# Altium footprint library SOM-PX30-BASEBOARD.PcbLib: 17 footprints (part 1 of 2)
Each footprint in its own frame and in the unit in brackets; x right, y up, seen from the top. Pads: shape width x height; smd on the part's side, far side on the other; paste and mask are expansions set on the pad; w line width, h text height; cw(c..) or ccw(c..) is an arc to the next point about the centre after c.
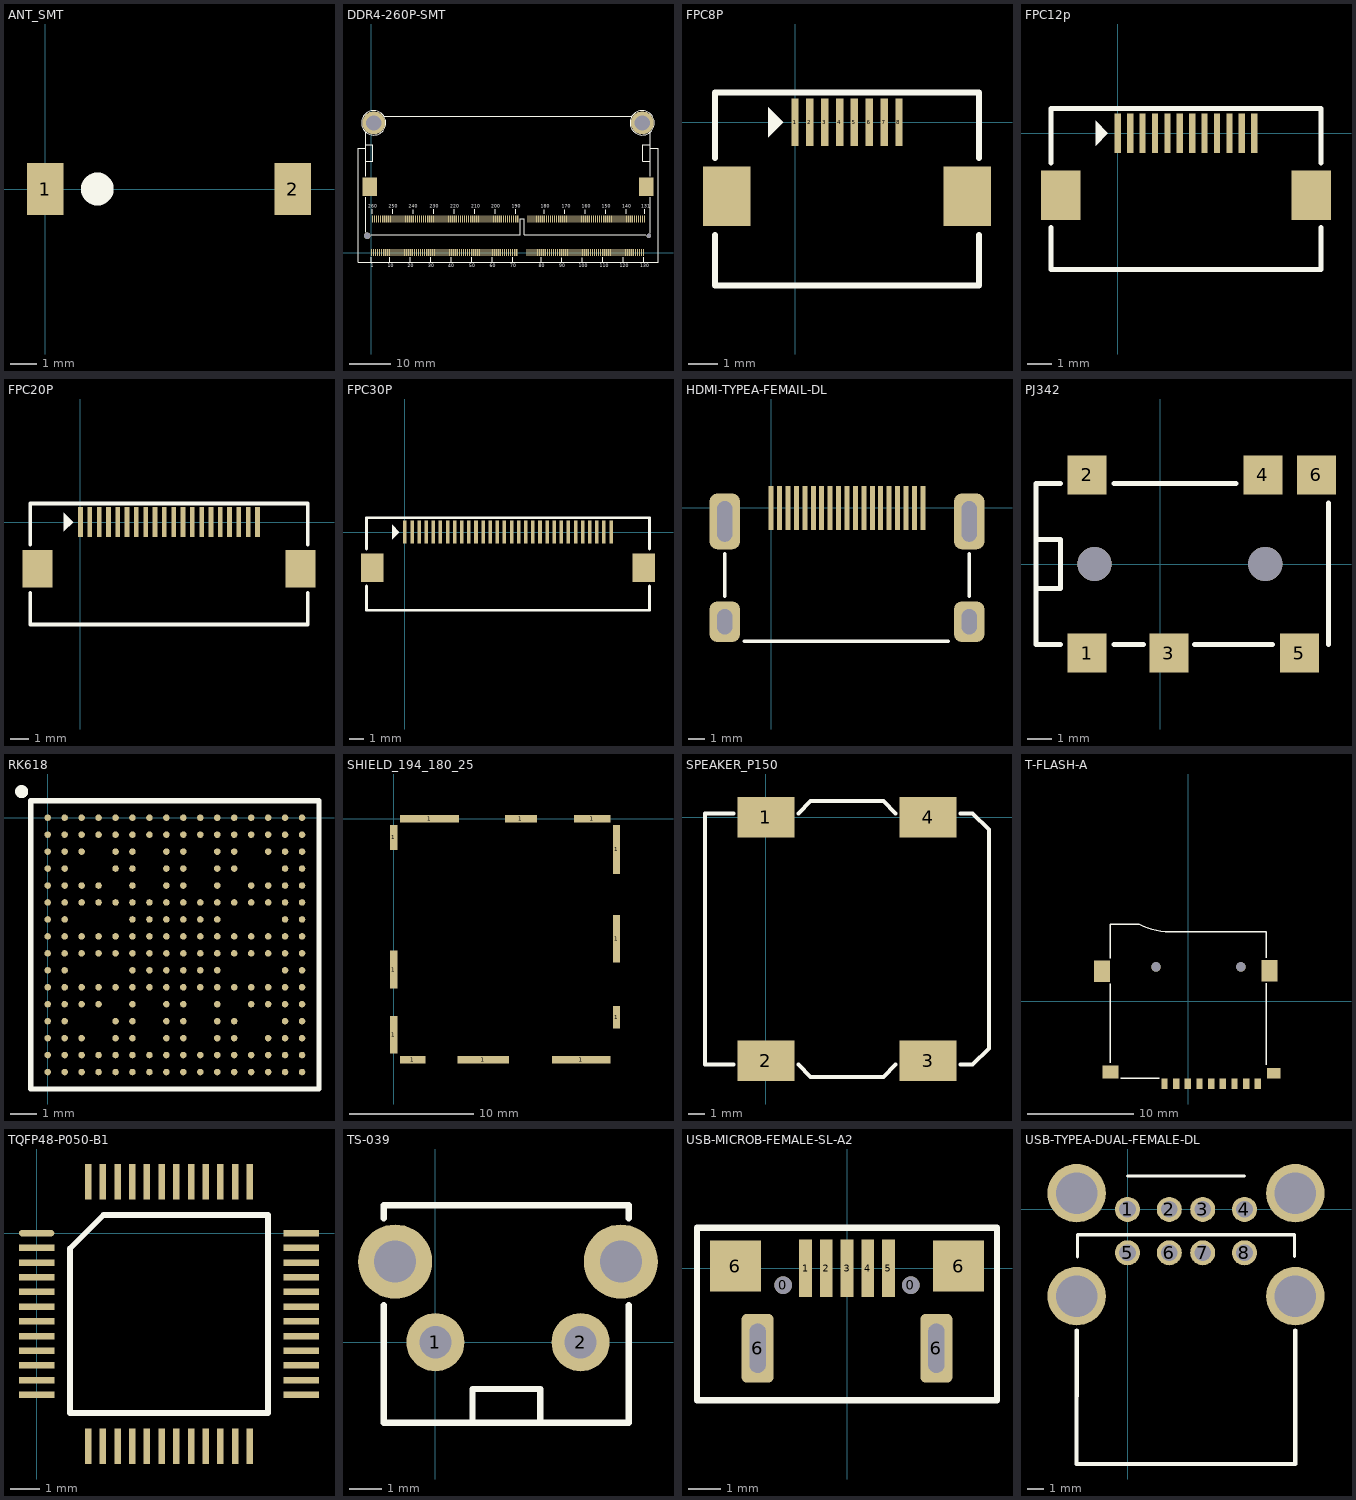
[diagram p0: the footprints below, top view; thin cyan lines are the x and y axes]

## ANT_SMT [mm]
pads (2):
  rect 1.4x2 smd: 1(0,0) 2(9.5,0)
Top Overlay:
  circle w0.7: c2,0 r0.28

## DDR4-260P-SMT [mm] "DDR4-260P-SMT"
pads (266):
  rect 0.3x1.75 smd: 1(0,0) 2(0.5,0) 3(1,0) 4(1.5,0) 5(2,0) 6(2.5,0) 7(3,0) 8(3.5,0) 9(4,0) 10(4.5,0) 11(5,0) 12(5.5,0) 13(6,0) 14(6.5,0) 15(7,0) 16(7.5,0) 17(8,0) 18(8.5,0) 19(9,0) 20(9.5,0) 21(10,0) 22(10.5,0) 23(11,0) 24(11.5,0) 25(12,0) 26(12.5,0) 27(13,0) 28(13.5,0) 29(14,0) 30(14.5,0) 31(15,0) 32(15.5,0) 33(16,0) 34(16.5,0) 35(17,0) 36(17.5,0) 37(18,0) 38(18.5,0) 39(19,0) 40(19.5,0) 41(20,0) 42(20.5,0) 43(21,0) 44(21.5,0) 45(22,0) 46(22.5,0) 47(23,0) 48(23.5,0) 49(24,0) 50(24.5,0) 51(25,0) 52(25.5,0) 53(26,0) 54(26.5,0) 55(27,0) 56(27.5,0) 57(28,0) 58(28.5,0) 59(29,0) 60(29.5,0) 61(30,0) 62(30.5,0) 63(31,0) 64(31.5,0) 65(32,0) 66(32.5,0) 67(33,0) 68(33.5,0) 69(34,0) 70(34.5,0) 71(35,0) 72(35.5,0) 73(38,0) 74(38.5,0) 75(39,0) 76(39.5,0) 77(40,0) 78(40.5,0) 79(41,0) 80(41.5,0) 81(42,0) 82(42.5,0) 83(43,0) 84(43.5,0) 85(44,0) 86(44.5,0) 87(45,0) 88(45.5,0) 89(46,0) 90(46.5,0) 91(47,0) 92(47.5,0) 93(48,0) 94(48.5,0) 95(49,0) 96(49.5,0) 97(50,0) 98(50.5,0) 99(51,0) 100(51.5,0) 101(52,0) 102(52.5,0) 103(53,0) 104(53.5,0) 105(54,0) 106(54.5,0) 107(55,0) 108(55.5,0) 109(56,0) 110(56.5,0) 111(57,0) 112(57.5,0) 113(58,0) 114(58.5,0) 115(59,0) 116(59.5,0) 117(60,0) 118(60.5,0) 119(61,0) 120(61.5,0) 121(62,0) 122(62.5,0) 123(63,0) 124(63.5,0) 125(64,0) 126(64.5,0) 127(65,0) 128(65.5,0) 129(66,0) 130(66.5,0) 131(66.75,8.2) 132(66.25,8.2) 133(65.75,8.2) 134(65.25,8.2) 135(64.75,8.2) 136(64.25,8.2) 137(63.75,8.2) 138(63.25,8.2) 139(62.75,8.2) 140(62.25,8.2) 141(61.75,8.2) 142(61.25,8.2) 143(60.75,8.2) 144(60.25,8.2) 145(59.75,8.2) 146(59.25,8.2) 147(58.75,8.2) 148(58.25,8.2) 149(57.75,8.2) 150(57.25,8.2) 151(56.75,8.2) 152(56.25,8.2) 153(55.75,8.2) 154(55.25,8.2) 155(54.75,8.2) 156(54.25,8.2) 157(53.75,8.2) 158(53.25,8.2) 159(52.75,8.2) 160(52.25,8.2) 161(51.75,8.2) 162(51.25,8.2) 163(50.75,8.2) 164(50.25,8.2) 165(49.75,8.2) 166(49.25,8.2) 167(48.75,8.2) 168(48.25,8.2) 169(47.75,8.2) 170(47.25,8.2) 171(46.75,8.2) 172(46.25,8.2) 173(45.75,8.2) 174(45.25,8.2) 175(44.75,8.2) 176(44.25,8.2) 177(43.75,8.2) 178(43.25,8.2) 179(42.75,8.2) 180(42.25,8.2) 181(41.75,8.2) 182(41.25,8.2) 183(40.75,8.2) 184(40.25,8.2) 185(39.75,8.2) 186(39.25,8.2) 187(38.75,8.2) 188(38.25,8.2) 189(35.75,8.2) 190(35.25,8.2) 191(34.75,8.2) 192(34.25,8.2) 193(33.75,8.2) 194(33.25,8.2) 195(32.75,8.2) 196(32.25,8.2) 197(31.75,8.2) 198(31.25,8.2) 199(30.75,8.2) 200(30.25,8.2) 201(29.75,8.2) 202(29.25,8.2) 203(28.75,8.2) 204(28.25,8.2) 205(27.75,8.2) 206(27.25,8.2) 207(26.75,8.2) 208(26.25,8.2) 209(25.75,8.2) 210(25.25,8.2) 211(24.75,8.2) 212(24.25,8.2) 213(23.75,8.2) 214(23.25,8.2) 215(22.75,8.2) 216(22.25,8.2) 217(21.75,8.2) 218(21.25,8.2) 219(20.75,8.2) 220(20.25,8.2) 221(19.75,8.2) 222(19.25,8.2) 223(18.75,8.2) 224(18.25,8.2) 225(17.75,8.2) 226(17.25,8.2) 227(16.75,8.2) 228(16.25,8.2) 229(15.75,8.2) 230(15.25,8.2) 231(14.75,8.2) 232(14.25,8.2) 233(13.75,8.2) 234(13.25,8.2) 235(12.75,8.2) 236(12.25,8.2) 237(11.75,8.2) 238(11.25,8.2) 239(10.75,8.2) 240(10.25,8.2) 241(9.75,8.2) 242(9.25,8.2) 243(8.75,8.2) 244(8.25,8.2) 245(7.75,8.2) 246(7.25,8.2) 247(6.75,8.2) 248(6.25,8.2) 249(5.75,8.2) 250(5.25,8.2) 251(4.75,8.2) 252(4.25,8.2) 253(3.75,8.2) 254(3.25,8.2) 255(2.75,8.2) 256(2.25,8.2) 257(1.75,8.2) 258(1.25,8.2) 259(0.75,8.2) 260(0.25,8.2)
  round 1.6 hole 1.6: " "(-1.025,4.1)
  rect 3.5x4.6 smd: " "(-0.425,16.1) " "(67.175,16.1)
  round 1.1 hole 1.1: " "(67.775,4.1)
  round 5.6 hole 3.7: ""(0.575,31.7) ""(66.175,31.7)
Top Overlay:
  circle w0.15: c0.575,31.7 r2.973
  circle w0.15: c66.175,31.7 r2.973
  lines w0.15: -1.425,4.999 -1.425,13.499 ; -1.425,18.699 -1.425,22.3 ; -1.425,26.3 0.375,26.3 0.375,22.3 -1.425,22.3 ; -1.425,29.499 -1.425,25.55 ; -0.025,-2.225 -0.025,-1.175 ; -0.026,4.3 36.375,4.3 36.375,8.3 37.375,8.3 37.375,4.3 67.075,4.3 ; 0.225,9.5 0.225,10.55 ; 3.075,33.3 63.675,33.3 ; 4.5,-2.225 4.5,-1.175 ; 5.25,9.5 5.25,10.55 ; 9.5,-2.25 9.5,-1.2 ; 10.25,9.475 10.25,10.525 ; 14.5,-2.225 14.5,-1.175 ; 15.25,9.5 15.25,10.55 ; 19.5,-2.2 19.5,-1.15 ; 20.25,9.525 20.25,10.575 ; 24.5,-2.2 24.5,-1.15 ; 25.25,9.525 25.25,10.575 ; 29.5,-2.2 29.5,-1.15 ; 30.25,9.525 30.25,10.575 ; 34.475,-2.2 34.475,-1.15 ; 35.225,9.525 35.225,10.575 ; 41.5,-2.25 41.5,-1.2 ; 42.25,9.475 42.25,10.525 ; 46.475,-2.275 46.475,-1.225 ; 47.225,9.45 47.225,10.5 ; 51.5,-2.275 51.5,-1.225 ; 52.25,9.45 52.25,10.5 ; 56.5,-2.25 56.5,-1.2 ; 57.25,9.475 57.25,10.525 ; 61.525,-2.225 61.525,-1.175 ; 62.275,9.5 62.275,10.55 ; 66.5,-2.225 66.5,-1.175 ; 66.75,9.5 66.75,10.55 ; 68.175,4.699 68.175,13.499 ; 68.175,18.699 68.175,22.3 ; 68.175,26.3 66.35,26.3 66.35,22.3 68.175,22.3 ; 68.175,29.499 68.175,25.55 ; -1.425,22.3 -1.425,25.55 ; -1.425,25.55 -3.275,25.55 -3.275,-2.301 70.025,-2.301 70.025,25.55 68.175,25.55 ; 68.175,22.3 68.175,25.55
  text "1" at -0.175,-3.601 h0.8
  text "70" at 33.875,-3.601 h0.8
  text "90" at 45.875,-3.601 h0.8
  text "110" at 55.825,-3.601 h0.8
  text "10" at 4.025,-3.601 h0.8
  text "250" at 4.275,10.899 h0.8
  text "20" at 8.925,-3.601 h0.8
  text "30" at 13.875,-3.601 h0.8
  text "240" at 9.125,10.899 h0.8
  text "40" at 18.775,-3.601 h0.8
  text "220" at 19.325,10.899 h0.8
  text "60" at 28.975,-3.601 h0.8
  text "210" at 24.375,10.899 h0.8
  text "200" at 29.275,10.899 h0.8
  text "190" at 34.325,10.899 h0.8
  text "80" at 40.925,-3.601 h0.8
  text "180" at 41.375,10.899 h0.8
  text "170" at 46.475,10.899 h0.8
  text "100" at 50.625,-3.601 h0.8
  text "160" at 51.425,10.899 h0.8
  text "120" at 60.625,-3.601 h0.8
  text "140" at 61.275,10.899 h0.8
  text "130" at 65.675,-3.601 h0.8
  text "131" at 65.875,10.899 h0.8
  text "260" at -0.775,10.899 h0.8
  text "50" at 23.925,-3.601 h0.8
  text "230" at 14.275,10.899 h0.8
  text "150" at 56.325,10.899 h0.8
3D body "User Library-00003870_TEcon_2309409-1.STEP": height 5.27, standoff -0.28, extent -3.1,-0.6 69.9,25.25

## FPC8P [mm] "FPC30P-0D5"
pads (10):
  rect 0.25x1.6 smd: 1(0,0) 2(0.5,0) 3(1,0) 4(1.5,0) 5(2,0) 6(2.5,0) 7(3,0) 8(3.5,0)
  rect 1.6x2 smd: ""(-2.3,-2.5) ""(5.8,-2.5)
Top Overlay:
  region: -0.9,-0.5 -0.9,0.5 -0.4,0
  lines w0.2: -2.7,-3.8 -2.7,-5.5 6.2,-5.5 6.2,-3.8 ; -2.7,-1.2 -2.7,1 6.2,1 6.2,-1.2

## FPC12p [mm] "FPC30P-0D5"
pads (14):
  rect 0.25x1.6 smd: 1(0,0) 2(0.5,0) 3(1,0) 4(1.5,0) 5(2,0) 6(2.5,0) 7(3,0) 8(3.5,0) 9(4,0) 10(4.5,0) 11(5,0) 12(5.5,0)
  rect 1.6x2 smd: ""(-2.3,-2.5) ""(7.8,-2.5)
Top Overlay:
  region: -0.9,-0.5 -0.9,0.5 -0.4,0
  lines w0.2: -2.7,-3.8 -2.7,-5.5 8.2,-5.5 8.2,-3.8 ; -2.7,-1.2 -2.7,1 8.2,1 8.2,-1.2

## FPC20P [mm] "FPC30P-0D5"
pads (22):
  rect 0.25x1.6 smd: 1(0,0) 2(0.5,0) 3(1,0) 4(1.5,0) 5(2,0) 6(2.5,0) 7(3,0) 8(3.5,0) 9(4,0) 10(4.5,0) 11(5,0) 12(5.5,0) 13(6,0) 14(6.5,0) 15(7,0) 16(7.5,0) 17(8,0) 18(8.5,0) 19(9,0) 20(9.5,0)
  rect 1.6x2 smd: ""(-2.3,-2.5) ""(11.8,-2.5)
Top Overlay:
  region: -0.9,-0.5 -0.9,0.5 -0.4,0
  lines w0.2: -2.7,-3.8 -2.7,-5.5 12.2,-5.5 12.2,-3.8 ; -2.7,-1.2 -2.7,1 12.2,1 12.2,-1.2

## FPC30P [mm] "FPC30P-0D5"
pads (32):
  rect 0.25x1.6 smd: 1(0,0) 2(0.5,0) 3(1,0) 4(1.5,0) 5(2,0) 6(2.5,0) 7(3,0) 8(3.5,0) 9(4,0) 10(4.5,0) 11(5,0) 12(5.5,0) 13(6,0) 14(6.5,0) 15(7,0) 16(7.5,0) 17(8,0) 18(8.5,0) 19(9,0) 20(9.5,0) 21(10,0) 22(10.5,0) 23(11,0) 24(11.5,0) 25(12,0) 26(12.5,0) 27(13,0) 28(13.5,0) 29(14,0) 30(14.5,0)
  rect 1.6x2 smd: ""(-2.3,-2.5) ""(16.8,-2.5)
Top Overlay:
  region: -0.9,-0.5 -0.9,0.5 -0.4,0
  lines w0.2: -2.7,-3.8 -2.7,-5.5 17.2,-5.5 17.2,-3.8 ; -2.7,-1.2 -2.7,1 17.2,1 17.2,-1.2

## HDMI-TYPEA-FEMAIL-DL [mm]
pads (23):
  rect 0.3x2.6 smd: 1(0,0) 2(0.5,0) 3(1,0) 4(1.5,0) 5(2,0) 6(2.5,0) 7(3,0) 8(3.5,0) 9(4,0) 10(4.5,0) 11(5,0) 12(5.5,0) 13(6,0) 14(6.5,0) 15(7,0) 16(7.5,0) 17(8,0) 18(8.5,0) 19(9,0)
  rrect50% 1.8x2.4 hole 0.9 slot 1.5 at 90 deg: ""(-2.75,-6.75) ""(11.75,-6.75)
  rrect50% 1.8x3.3 hole 0.9 slot 2.4 at 90 deg: ""(-2.75,-0.8) ""(11.75,-0.8)
Top Overlay:
  lines w0.2: -2.75,-5.25 -2.75,-2.7 ; -1.6,-7.9 10.5,-7.9 ; 11.75,-5.25 11.75,-2.7
3D body "HDMI.STEP": height 6.23, standoff -2.15, extent -3,-11.4 12,0.75

## PJ342 [mm] "PJ-3537"
pads (8):
  rect 1.6x1.6 smd: 1(-3.001,-3.65) 2(-3.001,3.65) 3(0.349,-3.65) 4(4.2,3.65) 5(5.699,-3.65) 6(6.399,3.65)
  round 1.4 hole 1.4: " "(-2.701,0) " "(4.3,0)
Top Overlay:
  lines w0.201: -5.102,3.3 -5.102,-3.3 -4.1,-3.3 ; -5.1,-1 -4.1,-1 -4.1,1 -5.1,1 ; -5.1,3.3 -4.1,3.3 ; -1.9,-3.3 -0.7,-3.299 ; -1.9,3.3 3.1,3.3 ; 1.4,-3.299 4.6,-3.3 ; 6.9,-3.3 6.9,2.5
3D body "PJ342.STEP": height 4.75, standoff -0.6, extent -7.125,-4.125 6.875,4.175

## RK618 [mm]
pads (216):
  round 0.25 smd mask+0.05: A1(0,0) A2(0.65,0) A3(1.3,0) A4(1.95,0) A5(2.6,0) A6(3.25,0) A7(3.9,0) A8(4.55,0) A9(5.2,0) A10(5.85,0) A11(6.5,0) A12(7.15,0) A13(7.8,0) A14(8.45,0) A15(9.1,0) A16(9.75,0) B1(0,-0.65) B2(0.65,-0.65) B3(1.3,-0.65) B4(1.95,-0.65) B5(2.6,-0.65) B6(3.25,-0.65) B7(3.9,-0.65) B8(4.55,-0.65) B9(5.2,-0.65) B10(5.85,-0.65) B11(6.5,-0.65) B12(7.15,-0.65) B13(7.8,-0.65) B14(8.45,-0.65) B15(9.1,-0.65) B16(9.75,-0.65) C1(0,-1.3) C2(0.65,-1.3) C3(1.3,-1.3) C5(2.6,-1.3) C6(3.25,-1.3) C8(4.55,-1.3) C9(5.2,-1.3) C11(6.5,-1.3) C12(7.15,-1.3) C14(8.45,-1.3) C15(9.1,-1.3) C16(9.75,-1.3) D1(0,-1.95) D2(0.65,-1.95) D5(2.6,-1.95) D6(3.25,-1.95) D8(4.55,-1.95) D9(5.2,-1.95) D11(6.5,-1.95) D12(7.15,-1.95) D15(9.1,-1.95) D16(9.75,-1.95) E1(0,-2.6) E2(0.65,-2.6) E3(1.3,-2.6) E4(1.95,-2.6) E6(3.25,-2.6) E8(4.55,-2.6) E9(5.2,-2.6) E11(6.5,-2.6) E13(7.8,-2.6) E14(8.45,-2.6) E15(9.1,-2.6) E16(9.75,-2.6) F1(0,-3.25) F2(0.65,-3.25) F3(1.3,-3.25) F4(1.95,-3.25) F5(2.6,-3.25) F6(3.25,-3.25) F7(3.9,-3.25) F8(4.55,-3.25) F9(5.2,-3.25) F10(5.85,-3.25) F11(6.5,-3.25) F12(7.15,-3.25) F13(7.8,-3.25) F14(8.45,-3.25) F15(9.1,-3.25) F16(9.75,-3.25) G1(0,-3.9) G2(0.65,-3.9) G6(3.25,-3.9) G7(3.9,-3.9) G8(4.55,-3.9) G9(5.2,-3.9) G10(5.85,-3.9) G11(6.5,-3.9) G15(9.1,-3.9) G16(9.75,-3.9) H1(0,-4.55) H2(0.65,-4.55) H3(1.3,-4.55) H4(1.95,-4.55) H5(2.6,-4.55) H6(3.25,-4.55) H7(3.9,-4.55) H8(4.55,-4.55) H9(5.2,-4.55) H10(5.85,-4.55) H11(6.5,-4.55) H12(7.15,-4.55) H13(7.8,-4.55) H14(8.45,-4.55) H15(9.1,-4.55) H16(9.75,-4.55) J1(0,-5.2) J2(0.65,-5.2) J3(1.3,-5.2) J4(1.95,-5.2) J5(2.6,-5.2) J6(3.25,-5.2) J7(3.9,-5.2) J8(4.55,-5.2) J9(5.2,-5.2) J10(5.85,-5.2) J11(6.5,-5.2) J12(7.15,-5.2) J13(7.8,-5.2) J14(8.45,-5.2) J15(9.1,-5.2) J16(9.75,-5.2) K1(0,-5.85) K2(0.65,-5.85) K6(3.25,-5.85) K7(3.9,-5.85) K8(4.55,-5.85) K9(5.2,-5.85) K10(5.85,-5.85) K11(6.5,-5.85) K15(9.1,-5.85) K16(9.75,-5.85) L1(0,-6.5) L2(0.65,-6.5) L3(1.3,-6.5) L4(1.95,-6.5) L5(2.6,-6.5) L6(3.25,-6.5) L7(3.9,-6.5) L8(4.55,-6.5) L9(5.2,-6.5) L10(5.85,-6.5) L11(6.5,-6.5) L12(7.15,-6.5) L13(7.8,-6.5) L14(8.45,-6.5) L15(9.1,-6.5) L16(9.75,-6.5) M1(0,-7.15) M2(0.65,-7.15) M3(1.3,-7.15) M4(1.95,-7.15) M6(3.25,-7.15) M8(4.55,-7.15) M9(5.2,-7.15) M11(6.5,-7.15) M13(7.8,-7.15) M14(8.45,-7.15) M15(9.1,-7.15) M16(9.75,-7.15) N1(0,-7.8) N2(0.65,-7.8) N5(2.6,-7.8) N6(3.25,-7.8) N8(4.55,-7.8) N9(5.2,-7.8) N11(6.5,-7.8) N12(7.15,-7.8) N15(9.1,-7.8) N16(9.75,-7.8) P1(0,-8.45) P2(0.65,-8.45) P3(1.3,-8.45) P5(2.6,-8.45) P6(3.25,-8.45) P8(4.55,-8.45) P9(5.2,-8.45) P11(6.5,-8.45) P12(7.15,-8.45) P14(8.45,-8.45) P15(9.1,-8.45) P16(9.75,-8.45) R1(0,-9.1) R2(0.65,-9.1) R3(1.3,-9.1) R4(1.95,-9.1) R5(2.6,-9.1) R6(3.25,-9.1) R7(3.9,-9.1) R8(4.55,-9.1) R9(5.2,-9.1) R10(5.85,-9.1) R11(6.5,-9.1) R12(7.15,-9.1) R13(7.8,-9.1) R14(8.45,-9.1) R15(9.1,-9.1) R16(9.75,-9.1) T1(0,-9.75) T2(0.65,-9.75) T3(1.3,-9.75) T4(1.95,-9.75) T5(2.6,-9.75) T6(3.25,-9.75) T7(3.9,-9.75) T8(4.55,-9.75) T9(5.2,-9.75) T10(5.85,-9.75) T11(6.5,-9.75) T12(7.15,-9.75) T13(7.8,-9.75) T14(8.45,-9.75) T15(9.1,-9.75) T16(9.75,-9.75)
Top Overlay:
  circle w0.3: c-1,1 r0.1
  lines w0.2: -0.65,-10.4 -0.65,0.65 10.4,0.65 10.4,-10.4 -0.65,-10.4

## SHIELD_194_180_25 [mm]
pads (12):
  rect 0.6x3.06 smd: 1(0,-17.47) 1(0,-12.2)
  rect 0.6x2.04 smd: 1(0,-1.52)
  rect 2.05x0.6 smd: 1(1.525,-19.5)
  rect 4.78x0.6 smd: 1(2.89,0)
  rect 4.16x0.6 smd: 1(7.218,-19.5)
  rect 2.57x0.6 smd: 1(10.275,0)
  rect 4.71x0.6 smd: 1(15.145,-19.5)
  rect 2.93x0.6 smd: 1(16.035,0)
  rect 0.6x1.8 smd: 1(18,-16.06)
  rect 0.6x3.84 smd: 1(18,-9.7)
  rect 0.6x3.98 smd: 1(18,-2.49)

## SPEAKER_P150 [mm]
pads (4):
  rect 3.5x2.5 smd: 1(0,0) 2(0,-15) 3(10,-15) 4(10,0)
Top Overlay:
  lines w0.25: -2,-15.25 -3.75,-15.25 -3.75,0.25 -2,0.25 ; 2,-15.25 2.75,-16 7.25,-16 8,-15.25 ; 2,0.25 2.75,1 7.25,1 8,0.25 ; 12,-15.25 12.75,-15.25 13.75,-14.25 13.75,-0.75 12.75,0.25 12,0.25

## T-FLASH-A [mil] "T-FLASH-A"
pads (15):
  rect 23.6x39.4 smd: 1(-88.57,-305.13) 2(-45.27,-305.13) 3(-1.97,-305.13) 4(41.33,-305.13) 5(84.63,-305.13) 6(127.93,-305.13) 7(171.23,-305.13) 8(214.53,-305.13) 9(257.83,-305.13)
  round 35 hole 35: " "(-120.07,127.97) " "(194.93,127.97)
  rect 59.1x78.7 smd: ""(-320.87,112.17) ""(301.23,114.19)
  rect 59.1x47.2 smd: ""(-289.37,-261.83)
  rect 51.2x39.4 smd: ""(316.93,-265.73)
Top Overlay:
  lines w5: -289.37,-228.35 -289.37,64.96 ; -289.37,159.45 -289.37,285.47 -183.07,285.47 ccw(c-64.75,522.83) -53.17,257.87 289.33,257.87 289.33,161.42 ; -250,-285.43 -108.27,-285.43 ; 289.33,-234.29 289.33,66.93
3D body "TF-01A.step": height 80.71, standoff -13.78, extent -318.9,-311.43 314.96,390.17

## TQFP48-P050-B1 [mm]
pads (48):
  oval 1.2x0.22 smd: 1(0,0)
  rect 1.2x0.22 smd: 2(0,-0.5) 3(0,-1) 4(0,-1.5) 5(0,-2) 6(0,-2.5) 7(0,-3) 8(0,-3.5) 9(0,-4) 10(0,-4.5) 11(0,-5) 12(0,-5.5) 25(9,-5.5) 26(9,-5) 27(9,-4.5) 28(9,-4) 29(9,-3.5) 30(9,-3) 31(9,-2.5) 32(9,-2) 33(9,-1.5) 34(9,-1) 35(9,-0.5) 36(9,0)
  rect 0.22x1.2 smd: 13(1.75,-7.25) 14(2.25,-7.25) 15(2.75,-7.25) 16(3.25,-7.25) 17(3.75,-7.25) 18(4.25,-7.25) 19(4.75,-7.25) 20(5.25,-7.25) 21(5.75,-7.25) 22(6.25,-7.25) 23(6.75,-7.25) 24(7.25,-7.25) 37(7.25,1.75) 38(6.75,1.75) 39(6.25,1.75) 40(5.75,1.75) 41(5.25,1.75) 42(4.75,1.75) 43(4.25,1.75) 44(3.75,1.75) 45(3.25,1.75) 46(2.75,1.75) 47(2.25,1.75) 48(1.75,1.75)
Top Overlay:
  lines w0.2: 1.135,-6.115 1.135,-0.52 2.27,0.615 7.865,0.615 7.865,-6.115 1.135,-6.115

## TS-039 [mm] "TS-039"
pads (4):
  round 1.8 hole 1: 1(0,0) 2(4.5,0)
  round 2.3 hole 1.3: ""(-1.25,2.5) ""(5.75,2.5)
Top Overlay:
  lines w0.2: -1.6,1.15 -1.6,-2.5 6,-2.5 6,1.15 ; -1.6,3.85 -1.6,4.25 6,4.25 6,3.85 ; 1.15,-2.5 1.15,-1.45 2.2,-1.45 3.25,-1.45 3.25,-2.5
3D body "TS6-THT-RA_H-4.3.step": height 7, standoff -3.5, extent -1.997,-3.1 6.397,3.95

## USB-MICROB-FEMALE-SL-A2 [mm]
pads (11):
  round 0.55 hole 0.55 paste-5 mask+0.102: 0(-2,-0.525) 0(2,-0.525)
  rect 0.4x1.8 smd: 1(-1.3,0) 2(-0.65,0) 3(0,0) 4(0.65,0) 5(1.3,0)
  rect 1.6x1.6 smd: 6(-3.5,0.075) 6(3.5,0.075)
  rrect30% 1x2.15 hole 0.5 slot 1.55 at 90 deg paste+0: 6(-2.8,-2.5)
  rrect30% 1x2.15 hole 0.5 slot 1.55 at 90 deg: 6(2.8,-2.5)
Top Overlay:
  lines w0.2: -4.7,-4.125 4.7,-4.125 4.7,1.27 -4.7,1.27 -4.7,-4.125
3D body "User Library-usb_port_ch.STEP": height 2.82, standoff -0.75, extent -3.993,-5.108 4.007,0.492

## USB-TYPEA-DUAL-FEMALE-DL [mm]
pads (12):
  round 1.5 hole 1: 1(0,0) 2(2.5,0) 3(4.5,0) 4(7,0) 5(0,-2.6) 6(2.5,-2.6) 7(4.5,-2.6) 8(7,-2.6)
  round 3.5 hole 2.5: ""(-3.05,-5.2) ""(-3.05,0.967) ""(10.05,-5.2) ""(10.05,0.967)
Top Overlay:
  lines w0.2: -3,-2.833 -3,-1.513 10,-1.513 10,-2.813 ; 0,2 7,2
  lines w0.25: -3.047,-15.25 10.047,-15.25
  lines w0.254: -3.053,-15.25 -3.05,-7.25 ; 10.047,-15.25 10.05,-7.25
3D body "usb double.STEP": height 15.69, standoff -3.06, extent -4.298,-15.99 11.299,1.93